# Altium footprint library Connector-Header.PcbLib: 166 footprints (part 10 of 11)
Each footprint in its own frame and in the unit in brackets; x right, y up, seen from the top. Pads: shape width x height; smd on the part's side, far side on the other; paste and mask are expansions set on the pad; w line width, h text height; cw(c..) or ccw(c..) is an arc to the next point about the centre after c.
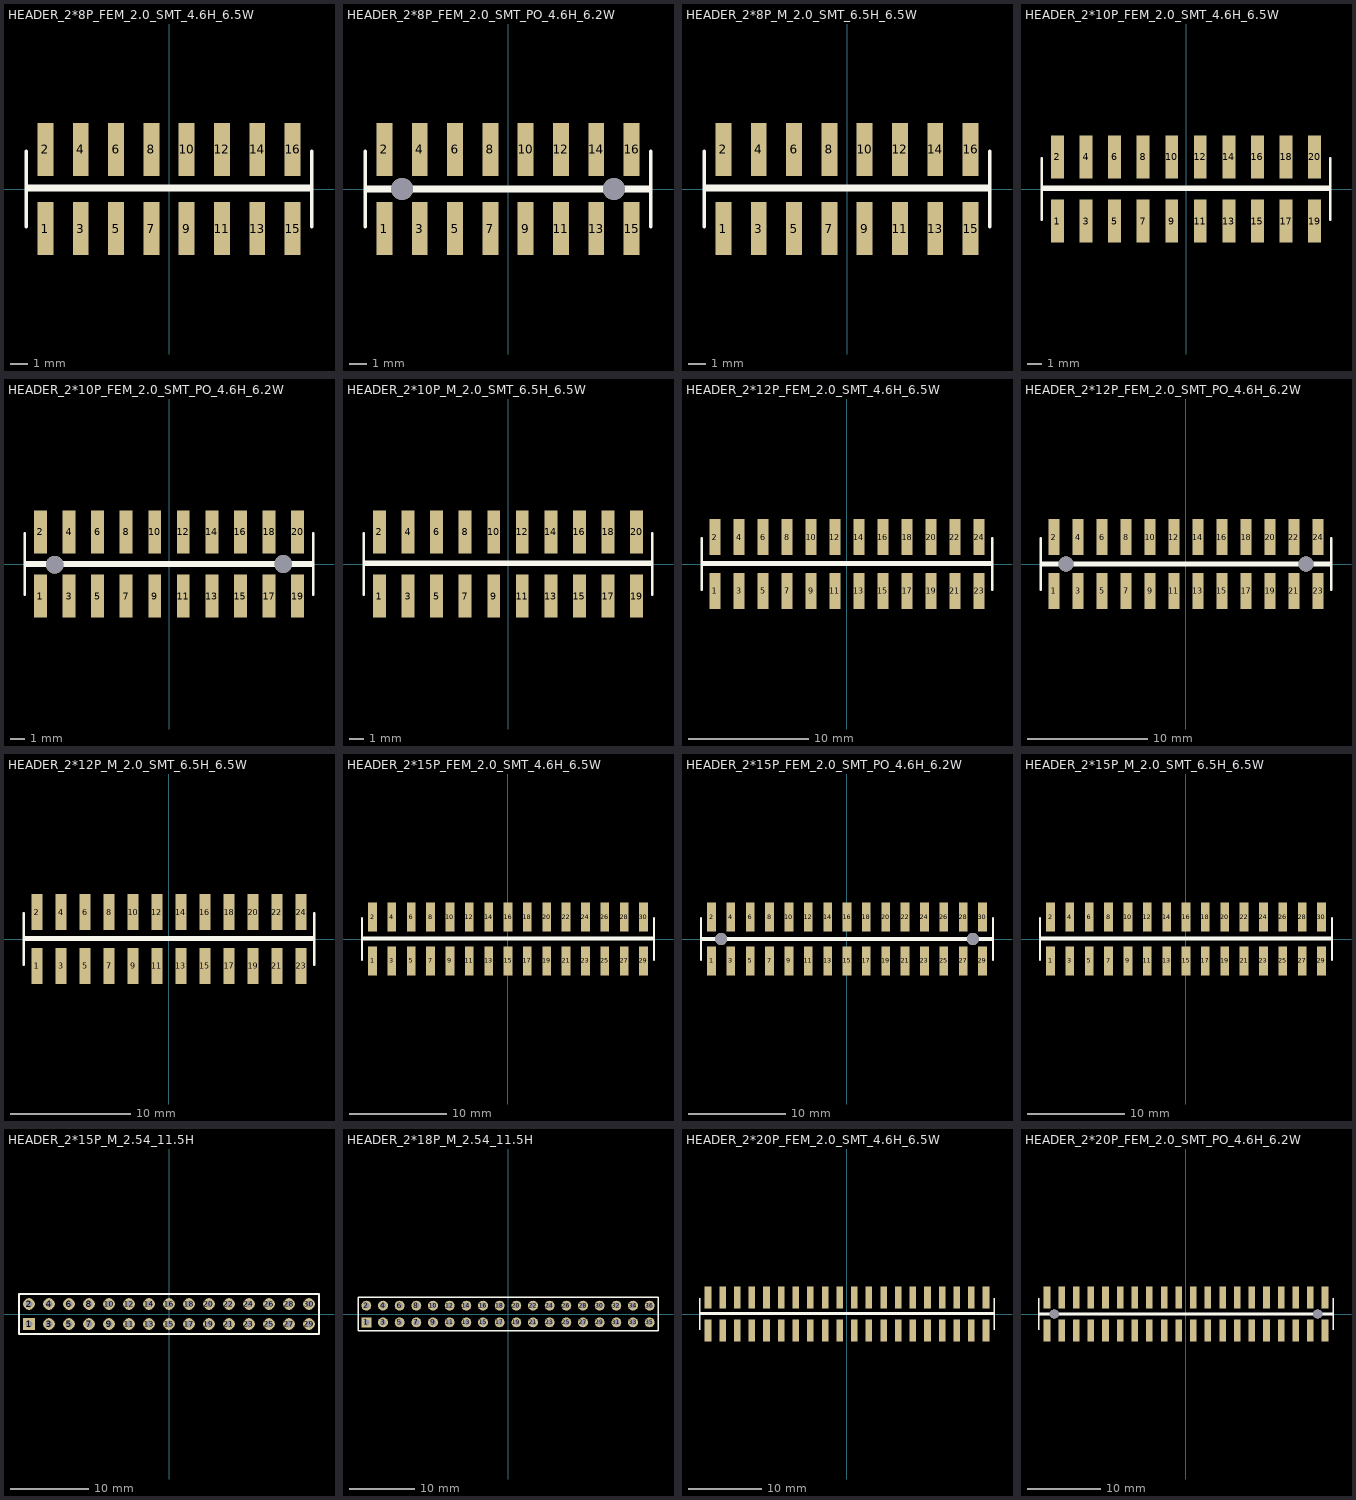
[diagram p9: the footprints below, top view; thin cyan lines are the x and y axes]

## HEADER_2*8P_FEM_2.0_SMT_4.6H_6.5W [mm]
pads (16):
  rect 0.9x3 smd: 1(-7,-2.25) 2(-7,2.25) 3(-5,-2.25) 4(-5,2.25) 5(-3,-2.25) 6(-3,2.25) 7(-1,-2.25) 8(-1,2.25) 9(1,-2.25) 10(1,2.25) 11(3,-2.25) 12(3,2.25) 13(5,-2.25) 14(5,2.25) 15(7,-2.25) 16(7,2.25)
Top Overlay:
  lines w0.203: -8.1,-2.15 -8.1,2.15 ; -8.1,-0.05 8.1,-0.05 ; -8.1,0.15 8.1,0.15 ; 8.1,-2.15 8.1,2.15

## HEADER_2*8P_FEM_2.0_SMT_PO_4.6H_6.2W [mm]
pads (18):
  rect 0.9x3 smd: 1(-7,-2.25) 2(-7,2.25) 3(-5,-2.25) 4(-5,2.25) 5(-3,-2.25) 6(-3,2.25) 7(-1,-2.25) 8(-1,2.25) 9(1,-2.25) 10(1,2.25) 11(3,-2.25) 12(3,2.25) 13(5,-2.25) 14(5,2.25) 15(7,-2.25) 16(7,2.25)
  round 1.25 hole 1.25: ""(-6,0) ""(6,0)
Top Overlay:
  lines w0.203: -8.1,-2.15 -8.1,2.15 ; -8.1,-0.1 8.1,-0.1 ; -8.1,0.1 8.1,0.1 ; 8.1,-2.15 8.1,2.15

## HEADER_2*8P_M_2.0_SMT_6.5H_6.5W [mm]
pads (16):
  rect 0.9x3 smd: 1(-7,-2.25) 2(-7,2.25) 3(-5,-2.25) 4(-5,2.25) 5(-3,-2.25) 6(-3,2.25) 7(-1,-2.25) 8(-1,2.25) 9(1,-2.25) 10(1,2.25) 11(3,-2.25) 12(3,2.25) 13(5,-2.25) 14(5,2.25) 15(7,-2.25) 16(7,2.25)
Top Overlay:
  lines w0.203: -8.1,-2.15 -8.1,2.15 ; -8.1,-0.05 8.1,-0.05 ; -8.1,0.15 8.1,0.15 ; 8.1,-2.15 8.1,2.15

## HEADER_2*10P_FEM_2.0_SMT_4.6H_6.5W [mm]
pads (20):
  rect 0.9x3 smd: 1(-9,-2.25) 2(-9,2.25) 3(-7,-2.25) 4(-7,2.25) 5(-5,-2.25) 6(-5,2.25) 7(-3,-2.25) 8(-3,2.25) 9(-1,-2.25) 10(-1,2.25) 11(1,-2.25) 12(1,2.25) 13(3,-2.25) 14(3,2.25) 15(5,-2.25) 16(5,2.25) 17(7,-2.25) 18(7,2.25) 19(9,-2.25) 20(9,2.25)
Top Overlay:
  lines w0.203: -10.1,-2.15 -10.1,2.15 ; -10.1,-0.05 10.1,-0.05 ; -10.1,0.15 10.1,0.15 ; 10.1,-2.15 10.1,2.15

## HEADER_2*10P_FEM_2.0_SMT_PO_4.6H_6.2W [mm]
pads (22):
  rect 0.9x3 smd: 1(-9,-2.25) 2(-9,2.25) 3(-7,-2.25) 4(-7,2.25) 5(-5,-2.25) 6(-5,2.25) 7(-3,-2.25) 8(-3,2.25) 9(-1,-2.25) 10(-1,2.25) 11(1,-2.25) 12(1,2.25) 13(3,-2.25) 14(3,2.25) 15(5,-2.25) 16(5,2.25) 17(7,-2.25) 18(7,2.25) 19(9,-2.25) 20(9,2.25)
  round 1.25 hole 1.25: ""(-8,-0.05) ""(8,0)
Top Overlay:
  lines w0.203: -10.1,-2.15 -10.1,2.15 ; -10.1,-0.1 10.1,-0.1 ; -10.1,0.1 10.1,0.1 ; 10.1,-2.15 10.1,2.15

## HEADER_2*10P_M_2.0_SMT_6.5H_6.5W [mm]
pads (20):
  rect 0.9x3 smd: 1(-9,-2.25) 2(-9,2.25) 3(-7,-2.25) 4(-7,2.25) 5(-5,-2.25) 6(-5,2.25) 7(-3,-2.25) 8(-3,2.25) 9(-1,-2.25) 10(-1,2.25) 11(1,-2.25) 12(1,2.25) 13(3,-2.25) 14(3,2.25) 15(5,-2.25) 16(5,2.25) 17(7,-2.25) 18(7,2.25) 19(9,-2.25) 20(9,2.25)
Top Overlay:
  lines w0.203: -10.1,-2.15 -10.1,2.15 ; -10.1,-0.05 10.1,-0.05 ; -10.1,0.15 10.1,0.15 ; 10.1,-2.15 10.1,2.15

## HEADER_2*12P_FEM_2.0_SMT_4.6H_6.5W [mm]
pads (24):
  rect 0.9x3 smd: 1(-11,-2.25) 2(-11,2.25) 3(-9,-2.25) 4(-9,2.25) 5(-7,-2.25) 6(-7,2.25) 7(-5,-2.25) 8(-5,2.25) 9(-3,-2.25) 10(-3,2.25) 11(-1,-2.25) 12(-1,2.25) 13(1,-2.25) 14(1,2.25) 15(3,-2.25) 16(3,2.25) 17(5,-2.25) 18(5,2.25) 19(7,-2.25) 20(7,2.25) 21(9,-2.25) 22(9,2.25) 23(11,-2.25) 24(11,2.25)
Top Overlay:
  lines w0.203: -12.1,-2.15 -12.1,2.15 ; -12.1,-0.05 12.1,-0.05 ; -12.1,0.15 12,0.15 ; 12.1,-2.15 12.1,2.15

## HEADER_2*12P_FEM_2.0_SMT_PO_4.6H_6.2W [mm]
pads (26):
  rect 0.9x3 smd: 1(-11,-2.25) 2(-11,2.25) 3(-9,-2.25) 4(-9,2.25) 5(-7,-2.25) 6(-7,2.25) 7(-5,-2.25) 8(-5,2.25) 9(-3,-2.25) 10(-3,2.25) 11(-1,-2.25) 12(-1,2.25) 13(1,-2.25) 14(1,2.25) 15(3,-2.25) 16(3,2.25) 17(5,-2.25) 18(5,2.25) 19(7,-2.25) 20(7,2.25) 21(9,-2.25) 22(9,2.25) 23(11,-2.25) 24(11,2.25)
  round 1.25 hole 1.25: ""(-10,0) ""(10,0)
Top Overlay:
  lines w0.203: -12.1,-2.15 -12.1,2.15 ; -12.1,-0.1 12.1,-0.1 ; -12.1,0.1 12,0.1 ; 12.1,-2.15 12.1,2.15

## HEADER_2*12P_M_2.0_SMT_6.5H_6.5W [mm]
pads (24):
  rect 0.9x3 smd: 1(-11,-2.25) 2(-11,2.25) 3(-9,-2.25) 4(-9,2.25) 5(-7,-2.25) 6(-7,2.25) 7(-5,-2.25) 8(-5,2.25) 9(-3,-2.25) 10(-3,2.25) 11(-1,-2.25) 12(-1,2.25) 13(1,-2.25) 14(1,2.25) 15(3,-2.25) 16(3,2.25) 17(5,-2.25) 18(5,2.25) 19(7,-2.25) 20(7,2.25) 21(9,-2.25) 22(9,2.25) 23(11,-2.25) 24(11,2.25)
Top Overlay:
  lines w0.203: -12.1,-2.15 -12.1,2.15 ; -12.1,-0.05 12.1,-0.05 ; -12.1,0.15 12,0.15 ; 12.1,-2.15 12.1,2.15

## HEADER_2*15P_FEM_2.0_SMT_4.6H_6.5W [mm]
pads (30):
  rect 0.9x3 smd: 1(-14,-2.25) 2(-14,2.25) 3(-12,-2.25) 4(-12,2.25) 5(-10,-2.25) 6(-10,2.25) 7(-8,-2.25) 8(-8,2.25) 9(-6,-2.25) 10(-6,2.25) 11(-4,-2.25) 12(-4,2.25) 13(-2,-2.25) 14(-2,2.25) 15(0,-2.25) 16(0,2.25) 17(2,-2.25) 18(2,2.25) 19(4,-2.25) 20(4,2.25) 21(6,-2.25) 22(6,2.25) 23(8,-2.25) 24(8,2.25) 25(10,-2.25) 26(10,2.25) 27(12,-2.25) 28(12,2.25) 29(14,-2.25) 30(14,2.25)
Top Overlay:
  lines w0.203: -15.1,-2.15 -15.1,2.15 ; -15.1,-0.05 15.1,-0.05 ; -15.1,0.15 15.1,0.15 ; 15.1,-2.15 15.1,2.15

## HEADER_2*15P_FEM_2.0_SMT_PO_4.6H_6.2W [mm]
pads (32):
  rect 0.9x3 smd: 1(-14,-2.25) 2(-14,2.25) 3(-12,-2.25) 4(-12,2.25) 5(-10,-2.25) 6(-10,2.25) 7(-8,-2.25) 8(-8,2.25) 9(-6,-2.25) 10(-6,2.25) 11(-4,-2.25) 12(-4,2.25) 13(-2,-2.25) 14(-2,2.25) 15(0,-2.25) 16(0,2.25) 17(2,-2.25) 18(2,2.25) 19(4,-2.25) 20(4,2.25) 21(6,-2.25) 22(6,2.25) 23(8,-2.25) 24(8,2.25) 25(10,-2.25) 26(10,2.25) 27(12,-2.25) 28(12,2.25) 29(14,-2.25) 30(14,2.25)
  round 1.25 hole 1.25: ""(-13,0) ""(13,0)
Top Overlay:
  lines w0.203: -15.1,-2.15 -15.1,2.15 ; -15.1,-0.1 15.1,-0.1 ; -15.1,0.1 15.1,0.1 ; 15.1,-2.15 15.1,2.15

## HEADER_2*15P_M_2.0_SMT_6.5H_6.5W [mm]
pads (30):
  rect 0.9x3 smd: 1(-14,-2.25) 2(-14,2.25) 3(-12,-2.25) 4(-12,2.25) 5(-10,-2.25) 6(-10,2.25) 7(-8,-2.25) 8(-8,2.25) 9(-6,-2.25) 10(-6,2.25) 11(-4,-2.25) 12(-4,2.25) 13(-2,-2.25) 14(-2,2.25) 15(0,-2.25) 16(0,2.25) 17(2,-2.25) 18(2,2.25) 19(4,-2.25) 20(4,2.25) 21(6,-2.25) 22(6,2.25) 23(8,-2.25) 24(8,2.25) 25(10,-2.25) 26(10,2.25) 27(12,-2.25) 28(12,2.25) 29(14,-2.25) 30(14,2.25)
Top Overlay:
  lines w0.203: -15.1,-2.15 -15.1,2.15 ; -15.1,-0.05 15.1,-0.05 ; -15.1,0.15 15.1,0.15 ; 15.1,-2.15 15.1,2.15

## HEADER_2*15P_M_2.54_11.5H [mm] "Connector; Header; 18x2 Position"
pads (30):
  rect 1.5x1.5 hole 0.9: 1(-17.78,-1.27)
  round 1.5 hole 0.9: 2(-17.78,1.27) 3(-15.24,-1.27) 4(-15.24,1.27) 5(-12.7,-1.27) 6(-12.7,1.27) 7(-10.16,-1.27) 8(-10.16,1.27) 9(-7.62,-1.27) 10(-7.62,1.27) 11(-5.08,-1.27) 12(-5.08,1.27) 13(-2.54,-1.27) 14(-2.54,1.27) 15(0,-1.27) 16(0,1.27) 17(2.54,-1.27) 18(2.54,1.27) 19(5.08,-1.27) 20(5.08,1.27) 21(7.62,-1.27) 22(7.62,1.27) 23(10.16,-1.27) 24(10.16,1.27) 25(12.7,-1.27) 26(12.7,1.27) 27(15.24,-1.27) 28(15.24,1.27) 29(17.78,-1.27) 30(17.78,1.27)
Top Overlay:
  lines w0.2: -19.05,-2.54 19.05,-2.54 19.05,2.54 -19.05,2.54 -19.05,-2.54

## HEADER_2*18P_M_2.54_11.5H [mm] "Connector; Header; 18x2 Position"
pads (36):
  rect 1.5x1.5 hole 0.9: 1(-21.59,-1.27)
  round 1.5 hole 0.9: 2(-21.59,1.27) 3(-19.05,-1.27) 4(-19.05,1.27) 5(-16.51,-1.27) 6(-16.51,1.27) 7(-13.97,-1.27) 8(-13.97,1.27) 9(-11.43,-1.27) 10(-11.43,1.27) 11(-8.89,-1.27) 12(-8.89,1.27) 13(-6.35,-1.27) 14(-6.35,1.27) 15(-3.81,-1.27) 16(-3.81,1.27) 17(-1.27,-1.27) 18(-1.27,1.27) 19(1.27,-1.27) 20(1.27,1.27) 21(3.81,-1.27) 22(3.81,1.27) 23(6.35,-1.27) 24(6.35,1.27) 25(8.89,-1.27) 26(8.89,1.27) 27(11.43,-1.27) 28(11.43,1.27) 29(13.97,-1.27) 30(13.97,1.27) 31(16.51,-1.27) 32(16.51,1.27) 33(19.05,-1.27) 34(19.05,1.27) 35(21.59,-1.27) 36(21.59,1.27)
Top Overlay:
  lines w0.2: -22.86,-2.54 -22.86,2.54 22.86,2.54 22.86,-2.54 -22.86,-2.54

## HEADER_2*20P_FEM_2.0_SMT_4.6H_6.5W [mm]
pads (40):
  rect 0.9x3 smd: 1(-19,-2.25) 2(-19,2.25) 3(-17,-2.25) 4(-17,2.25) 5(-15,-2.25) 6(-15,2.25) 7(-13,-2.25) 8(-13,2.25) 9(-11,-2.25) 10(-11,2.25) 11(-9,-2.25) 12(-9,2.25) 13(-7,-2.25) 14(-7,2.25) 15(-5,-2.25) 16(-5,2.25) 17(-3,-2.25) 18(-3,2.25) 19(-1,-2.25) 20(-1,2.25) 21(1,-2.25) 22(1,2.25) 23(3,-2.25) 24(3,2.25) 25(5,-2.25) 26(5,2.25) 27(7,-2.25) 28(7,2.25) 29(9,-2.25) 30(9,2.25) 31(11,-2.25) 32(11,2.25) 33(13,-2.25) 34(13,2.25) 35(15,-2.25) 36(15,2.25) 37(17,-2.25) 38(17,2.25) 39(19,-2.25) 40(19,2.25)
Top Overlay:
  lines w0.203: -20.1,-2.15 -20.1,2.15 ; -20.1,-0.05 20.1,-0.05 ; -20.1,0.15 20.1,0.15 ; 20.1,-2.15 20.1,2.15

## HEADER_2*20P_FEM_2.0_SMT_PO_4.6H_6.2W [mm]
pads (42):
  rect 0.9x3 smd: 1(-19,-2.25) 2(-19,2.25) 3(-17,-2.25) 4(-17,2.25) 5(-15,-2.25) 6(-15,2.25) 7(-13,-2.25) 8(-13,2.25) 9(-11,-2.25) 10(-11,2.25) 11(-9,-2.25) 12(-9,2.25) 13(-7,-2.25) 14(-7,2.25) 15(-5,-2.25) 16(-5,2.25) 17(-3,-2.25) 18(-3,2.25) 19(-1,-2.25) 20(-1,2.25) 21(1,-2.25) 22(1,2.25) 23(3,-2.25) 24(3,2.25) 25(5,-2.25) 26(5,2.25) 27(7,-2.25) 28(7,2.25) 29(9,-2.25) 30(9,2.25) 31(11,-2.25) 32(11,2.25) 33(13,-2.25) 34(13,2.25) 35(15,-2.25) 36(15,2.25) 37(17,-2.25) 38(17,2.25) 39(19,-2.25) 40(19,2.25)
  round 1.25 hole 1.25: ""(-18,0) ""(18,0)
Top Overlay:
  lines w0.203: -20.1,-2.15 -20.1,2.15 ; -20.1,-0.1 20.1,-0.1 ; -20.1,0.1 20.1,0.1 ; 20.1,-2.15 20.1,2.15